# Altium schematic symbol library jlcpcb_2025_04_resistors_extended_0201.schlib: 1508 symbols (part 2 of 8) (continued)
## 0201WMJ0153TEE
designator R?  Resistance: 15kΩ  (hidden comment: *)
Resistor, 15kΩ, ±5%, 50mW, 25V, ±200ppm/℃, -55℃~+155℃, SMD 0201; Manufacturer: Uniroyal; Manufacturer Part Number: 0201WMJ0153TEE; Supplier 1: LCSC; Supplier Part Number 1: C473455; JLCPCB Part Number: C473455; Power Rating: 50mW; Category: Resistors; Package Size: 0201; JLCPCB Basic Part: Yes; Tolerance: ±5%; Voltage Rating: 25V; Temperature Coefficient: ±200ppm/℃; Temperature Rating: -55℃~+155℃; ComponentLink1Description: Datasheet; ComponentLink1URL: https://wmsc.lcsc.com/wmsc/upload/file/pdf/v2/lcsc/2205312145_UNI-ROYAL-Uniroyal-Elec-0201WMJ0153TEE_C473455.pdf; ComponentLink2Description: JLCPCB Part URL; ComponentLink2URL: https://jlcpcb.com/partdetail/C473455
pins: 1, 2
1 alternate drawing of the same symbol

## 0201WMJ0154TEE
designator R?  Resistance: 150kΩ  (hidden comment: *)
Resistor, 150kΩ, ±5%, 50mW, 25V, ±200ppm/℃, -55℃~+155℃, SMD 0201; Manufacturer: Uniroyal; Manufacturer Part Number: 0201WMJ0154TEE; Supplier 1: LCSC; Supplier Part Number 1: C473479; JLCPCB Part Number: C473479; Power Rating: 50mW; Category: Resistors; Package Size: 0201; JLCPCB Basic Part: Yes; Tolerance: ±5%; Voltage Rating: 25V; Temperature Coefficient: ±200ppm/℃; Temperature Rating: -55℃~+155℃; ComponentLink1Description: Datasheet; ComponentLink1URL: https://wmsc.lcsc.com/wmsc/upload/file/pdf/v2/lcsc/2205312145_UNI-ROYAL-Uniroyal-Elec-0201WMJ0154TEE_C473479.pdf; ComponentLink2Description: JLCPCB Part URL; ComponentLink2URL: https://jlcpcb.com/partdetail/C473479
pins: 1, 2
1 alternate drawing of the same symbol

## 0201WMJ0155TEE
designator R?  Resistance: 1500000Ω  (hidden comment: *)
Resistor, 1500000Ω, ±5%, 50mW, 25V, ±200ppm/℃, -55℃~+155℃, SMD 0201; Manufacturer: Uniroyal; Manufacturer Part Number: 0201WMJ0155TEE; Supplier 1: LCSC; Supplier Part Number 1: C423378; JLCPCB Part Number: C423378; Power Rating: 50mW; Category: Resistors; Package Size: 0201; JLCPCB Basic Part: Yes; Tolerance: ±5%; Voltage Rating: 25V; Temperature Coefficient: ±200ppm/℃; Temperature Rating: -55℃~+155℃; ComponentLink1Description: Datasheet; ComponentLink1URL: https://wmsc.lcsc.com/wmsc/upload/file/pdf/v2/lcsc/2205312145_UNI-ROYAL-Uniroyal-Elec-0201WMJ0155TEE_C423378.pdf; ComponentLink2Description: JLCPCB Part URL; ComponentLink2URL: https://jlcpcb.com/partdetail/C423378
pins: 1, 2
1 alternate drawing of the same symbol

## 0201WMJ0182TEE
designator R?  Resistance: 1.8kΩ  (hidden comment: *)
Resistor, 1.8kΩ, ±5%, 50mW, 25V, ±200ppm/℃, -55℃~+155℃, SMD 0201; Manufacturer: Uniroyal; Manufacturer Part Number: 0201WMJ0182TEE; Supplier 1: LCSC; Supplier Part Number 1: C473538; JLCPCB Part Number: C473538; Power Rating: 50mW; Category: Resistors; Package Size: 0201; JLCPCB Basic Part: Yes; Tolerance: ±5%; Voltage Rating: 25V; Temperature Coefficient: ±200ppm/℃; Temperature Rating: -55℃~+155℃; ComponentLink1Description: Datasheet; ComponentLink1URL: https://wmsc.lcsc.com/wmsc/upload/file/pdf/v2/lcsc/2205312145_UNI-ROYAL-Uniroyal-Elec-0201WMJ0182TEE_C473538.pdf; ComponentLink2Description: JLCPCB Part URL; ComponentLink2URL: https://jlcpcb.com/partdetail/C473538
pins: 1, 2
1 alternate drawing of the same symbol

## 0201WMJ0185TEE
designator R?  Resistance: 1.8MΩ  (hidden comment: *)
Resistor, 1.8MΩ, ±5%, 50mW, 25V, ±200ppm/℃, -55℃~+155℃, SMD 0201; Manufacturer: Uniroyal; Manufacturer Part Number: 0201WMJ0185TEE; Supplier 1: LCSC; Supplier Part Number 1: C474144; JLCPCB Part Number: C474144; Power Rating: 50mW; Category: Resistors; Package Size: 0201; JLCPCB Basic Part: Yes; Tolerance: ±5%; Voltage Rating: 25V; Temperature Coefficient: ±200ppm/℃; Temperature Rating: -55℃~+155℃; ComponentLink1Description: Datasheet; ComponentLink1URL: https://wmsc.lcsc.com/wmsc/upload/file/pdf/v2/lcsc/2205312130_UNI-ROYAL-Uniroyal-Elec-0201WMJ0185TEE_C474144.pdf; ComponentLink2Description: JLCPCB Part URL; ComponentLink2URL: https://jlcpcb.com/partdetail/C474144
pins: 1, 2
1 alternate drawing of the same symbol

## 0201WMJ0200TEE
designator R?  Resistance: 20Ω  (hidden comment: *)
Resistor, 20Ω, ±5%, 50mW, 25V, ±200ppm/℃, -55℃~+155℃, SMD 0201; Manufacturer: Uniroyal; Manufacturer Part Number: 0201WMJ0200TEE; Supplier 1: LCSC; Supplier Part Number 1: C473477; JLCPCB Part Number: C473477; Power Rating: 50mW; Category: Resistors; Package Size: 0201; JLCPCB Basic Part: Yes; Tolerance: ±5%; Voltage Rating: 25V; Temperature Coefficient: ±200ppm/℃; Temperature Rating: -55℃~+155℃; ComponentLink1Description: Datasheet; ComponentLink1URL: https://wmsc.lcsc.com/wmsc/upload/file/pdf/v2/lcsc/2205312145_UNI-ROYAL-Uniroyal-Elec-0201WMJ0200TEE_C473477.pdf; ComponentLink2Description: JLCPCB Part URL; ComponentLink2URL: https://jlcpcb.com/partdetail/C473477
pins: 1, 2
1 alternate drawing of the same symbol

## 0201WMJ0202TEE
designator R?  Resistance: 2kΩ  (hidden comment: *)
Resistor, 2kΩ, ±5%, 50mW, 25V, ±200ppm/℃, -55℃~+155℃, SMD 0201; Manufacturer: Uniroyal; Manufacturer Part Number: 0201WMJ0202TEE; Supplier 1: LCSC; Supplier Part Number 1: C473459; JLCPCB Part Number: C473459; Power Rating: 50mW; Category: Resistors; Package Size: 0201; JLCPCB Basic Part: Yes; Tolerance: ±5%; Voltage Rating: 25V; Temperature Coefficient: ±200ppm/℃; Temperature Rating: -55℃~+155℃; ComponentLink1Description: Datasheet; ComponentLink1URL: https://wmsc.lcsc.com/wmsc/upload/file/pdf/v2/lcsc/2205312145_UNI-ROYAL-Uniroyal-Elec-0201WMJ0202TEE_C473459.pdf; ComponentLink2Description: JLCPCB Part URL; ComponentLink2URL: https://jlcpcb.com/partdetail/C473459
pins: 1, 2
1 alternate drawing of the same symbol

## 0201WMJ0204TEE
designator R?  Resistance: 200kΩ  (hidden comment: *)
Resistor, 200kΩ, ±5%, 50mW, 25V, ±200ppm/℃, -55℃~+155℃, SMD 0201; Manufacturer: Uniroyal; Manufacturer Part Number: 0201WMJ0204TEE; Supplier 1: LCSC; Supplier Part Number 1: C270326; JLCPCB Part Number: C270326; Power Rating: 50mW; Category: Resistors; Package Size: 0201; JLCPCB Basic Part: Yes; Tolerance: ±5%; Voltage Rating: 25V; Temperature Coefficient: ±200ppm/℃; Temperature Rating: -55℃~+155℃; ComponentLink1Description: Datasheet; ComponentLink1URL: https://wmsc.lcsc.com/wmsc/upload/file/pdf/v2/lcsc/2205311945_UNI-ROYAL-Uniroyal-Elec-0201WMJ0204TEE_C270326.pdf; ComponentLink2Description: JLCPCB Part URL; ComponentLink2URL: https://jlcpcb.com/partdetail/C270326
pins: 1, 2
1 alternate drawing of the same symbol

## 0201WMJ0220TEE
designator R?  Resistance: 22Ω  (hidden comment: *)
Resistor, 22Ω, ±5%, 50mW, 25V, ±200ppm/℃, -55℃~+155℃, SMD 0201; Manufacturer: Uniroyal; Manufacturer Part Number: 0201WMJ0220TEE; Supplier 1: LCSC; Supplier Part Number 1: C270325; JLCPCB Part Number: C270325; Power Rating: 50mW; Category: Resistors; Package Size: 0201; JLCPCB Basic Part: Yes; Tolerance: ±5%; Voltage Rating: 25V; Temperature Coefficient: ±200ppm/℃; Temperature Rating: -55℃~+155℃; ComponentLink1Description: Datasheet; ComponentLink1URL: https://wmsc.lcsc.com/wmsc/upload/file/pdf/v2/lcsc/2205311945_UNI-ROYAL-Uniroyal-Elec-0201WMJ0220TEE_C270325.pdf; ComponentLink2Description: JLCPCB Part URL; ComponentLink2URL: https://jlcpcb.com/partdetail/C270325
pins: 1, 2
1 alternate drawing of the same symbol

## 0201WMJ0222TEE
designator R?  Resistance: 2200Ω  (hidden comment: *)
Resistor, 2200Ω, ±5%, 50mW, 25V, ±200ppm/℃, -55℃~+155℃, SMD 0201; Manufacturer: Uniroyal; Manufacturer Part Number: 0201WMJ0222TEE; Supplier 1: LCSC; Supplier Part Number 1: C423368; JLCPCB Part Number: C423368; Power Rating: 50mW; Category: Resistors; Package Size: 0201; JLCPCB Basic Part: Yes; Tolerance: ±5%; Voltage Rating: 25V; Temperature Coefficient: ±200ppm/℃; Temperature Rating: -55℃~+155℃; ComponentLink1Description: Datasheet; ComponentLink1URL: https://wmsc.lcsc.com/wmsc/upload/file/pdf/v2/lcsc/2205312145_UNI-ROYAL-Uniroyal-Elec-0201WMJ0222TEE_C423368.pdf; ComponentLink2Description: JLCPCB Part URL; ComponentLink2URL: https://jlcpcb.com/partdetail/C423368
pins: 1, 2
1 alternate drawing of the same symbol

## 0201WMJ0225TEE
designator R?  Resistance: 2200000Ω  (hidden comment: *)
Resistor, 2200000Ω, ±5%, 50mW, 25V, ±200ppm/℃, -55℃~+155℃, SMD 0201; Manufacturer: Uniroyal; Manufacturer Part Number: 0201WMJ0225TEE; Supplier 1: LCSC; Supplier Part Number 1: C423366; JLCPCB Part Number: C423366; Power Rating: 50mW; Category: Resistors; Package Size: 0201; JLCPCB Basic Part: Yes; Tolerance: ±5%; Voltage Rating: 25V; Temperature Coefficient: ±200ppm/℃; Temperature Rating: -55℃~+155℃; ComponentLink1Description: Datasheet; ComponentLink1URL: https://wmsc.lcsc.com/wmsc/upload/file/pdf/v2/lcsc/2205312145_UNI-ROYAL-Uniroyal-Elec-0201WMJ0225TEE_C423366.pdf; ComponentLink2Description: JLCPCB Part URL; ComponentLink2URL: https://jlcpcb.com/partdetail/C423366
pins: 1, 2
1 alternate drawing of the same symbol

## 0201WMJ0240TCE
designator R?  Resistance: 24Ω  (hidden comment: *)
Resistor, 24Ω, ±5%, 50mW, 25V, ±200ppm/℃, -55℃~+155℃, SMD 0201; Manufacturer: Uniroyal; Manufacturer Part Number: 0201WMJ0240TCE; Supplier 1: LCSC; Supplier Part Number 1: C25060; JLCPCB Part Number: C25060; Power Rating: 50mW; Category: Resistors; Package Size: 0201; JLCPCB Basic Part: Yes; Tolerance: ±5%; Voltage Rating: 25V; Temperature Coefficient: ±200ppm/℃; Temperature Rating: -55℃~+155℃; ComponentLink1Description: Datasheet; ComponentLink1URL: https://wmsc.lcsc.com/wmsc/upload/file/pdf/v2/lcsc/2205311900_UNI-ROYAL-Uniroyal-Elec-0201WMJ0240TCE_C25060.pdf; ComponentLink2Description: JLCPCB Part URL; ComponentLink2URL: https://jlcpcb.com/partdetail/C25060
pins: 1, 2
1 alternate drawing of the same symbol

## 0201WMJ0242TCE
designator R?  Resistance: 2.4kΩ  (hidden comment: *)
Resistor, 2.4kΩ, ±5%, 50mW, 25V, ±200ppm/℃, -55℃~+155℃, SMD 0201; Manufacturer: Uniroyal; Manufacturer Part Number: 0201WMJ0242TCE; Supplier 1: LCSC; Supplier Part Number 1: C25842; JLCPCB Part Number: C25842; Power Rating: 50mW; Category: Resistors; Package Size: 0201; JLCPCB Basic Part: Yes; Tolerance: ±5%; Voltage Rating: 25V; Temperature Coefficient: ±200ppm/℃; Temperature Rating: -55℃~+155℃; ComponentLink1Description: Datasheet; ComponentLink1URL: https://wmsc.lcsc.com/wmsc/upload/file/pdf/v2/lcsc/2207131030_UNI-ROYAL-Uniroyal-Elec-0201WMJ0242TCE_C25842.pdf; ComponentLink2Description: JLCPCB Part URL; ComponentLink2URL: https://jlcpcb.com/partdetail/C25842
pins: 1, 2
1 alternate drawing of the same symbol

## 0201WMJ0242TEE
designator R?  Resistance: 2400Ω  (hidden comment: *)
Resistor, 2400Ω, ±5%, 50mW, 25V, ±200ppm/℃, -55℃~+155℃, SMD 0201; Manufacturer: Uniroyal; Manufacturer Part Number: 0201WMJ0242TEE; Supplier 1: LCSC; Supplier Part Number 1: C270321; JLCPCB Part Number: C270321; Power Rating: 50mW; Category: Resistors; Package Size: 0201; JLCPCB Basic Part: Yes; Tolerance: ±5%; Voltage Rating: 25V; Temperature Coefficient: ±200ppm/℃; Temperature Rating: -55℃~+155℃; ComponentLink1Description: Datasheet; ComponentLink1URL: https://wmsc.lcsc.com/wmsc/upload/file/pdf/v2/lcsc/2205311945_UNI-ROYAL-Uniroyal-Elec-0201WMJ0242TEE_C270321.pdf; ComponentLink2Description: JLCPCB Part URL; ComponentLink2URL: https://jlcpcb.com/partdetail/C270321
pins: 1, 2
1 alternate drawing of the same symbol

## 0201WMJ0271TEE
designator R?  Resistance: 270Ω  (hidden comment: *)
Resistor, 270Ω, ±5%, 50mW, 25V, ±200ppm/℃, -55℃~+155℃, SMD 0201; Manufacturer: Uniroyal; Manufacturer Part Number: 0201WMJ0271TEE; Supplier 1: LCSC; Supplier Part Number 1: C423363; JLCPCB Part Number: C423363; Power Rating: 50mW; Category: Resistors; Package Size: 0201; JLCPCB Basic Part: Yes; Tolerance: ±5%; Voltage Rating: 25V; Temperature Coefficient: ±200ppm/℃; Temperature Rating: -55℃~+155℃; ComponentLink1Description: Datasheet; ComponentLink1URL: https://wmsc.lcsc.com/wmsc/upload/file/pdf/v2/lcsc/2205312145_UNI-ROYAL-Uniroyal-Elec-0201WMJ0271TEE_C423363.pdf; ComponentLink2Description: JLCPCB Part URL; ComponentLink2URL: https://jlcpcb.com/partdetail/C423363
pins: 1, 2
1 alternate drawing of the same symbol

## 0201WMJ0272TEE
designator R?  Resistance: 2.7kΩ  (hidden comment: *)
Resistor, 2.7kΩ, ±5%, 50mW, 25V, ±200ppm/℃, -55℃~+155℃, SMD 0201; Manufacturer: Uniroyal; Manufacturer Part Number: 0201WMJ0272TEE; Supplier 1: LCSC; Supplier Part Number 1: C474193; JLCPCB Part Number: C474193; Power Rating: 50mW; Category: Resistors; Package Size: 0201; JLCPCB Basic Part: Yes; Tolerance: ±5%; Voltage Rating: 25V; Temperature Coefficient: ±200ppm/℃; Temperature Rating: -55℃~+155℃; ComponentLink1Description: Datasheet; ComponentLink1URL: https://wmsc.lcsc.com/wmsc/upload/file/pdf/v2/lcsc/2205312045_UNI-ROYAL-Uniroyal-Elec-0201WMJ0272TEE_C474193.pdf; ComponentLink2Description: JLCPCB Part URL; ComponentLink2URL: https://jlcpcb.com/partdetail/C474193
pins: 1, 2
1 alternate drawing of the same symbol

## 0201WMJ0274TCE
designator R?  Resistance: 270kΩ  (hidden comment: *)
Resistor, 270kΩ, ±5%, 50mW, 25V, ±200ppm/℃, -55℃~+155℃, SMD 0201; Manufacturer: Uniroyal; Manufacturer Part Number: 0201WMJ0274TCE; Supplier 1: LCSC; Supplier Part Number 1: C246801; JLCPCB Part Number: C246801; Power Rating: 50mW; Category: Resistors; Package Size: 0201; JLCPCB Basic Part: Yes; Tolerance: ±5%; Voltage Rating: 25V; Temperature Coefficient: ±200ppm/℃; Temperature Rating: -55℃~+155℃; ComponentLink1Description: Datasheet; ComponentLink1URL: https://wmsc.lcsc.com/wmsc/upload/file/pdf/v2/lcsc/2205312316_UNI-ROYAL-Uniroyal-Elec-0201WMJ0274TCE_C246801.pdf; ComponentLink2Description: JLCPCB Part URL; ComponentLink2URL: https://jlcpcb.com/partdetail/C246801
pins: 1, 2
1 alternate drawing of the same symbol

## 0201WMJ0300TEE
designator R?  Resistance: 30Ω  (hidden comment: *)
Resistor, 30Ω, ±5%, 50mW, 25V, ±200ppm/℃, -55℃~+155℃, SMD 0201; Manufacturer: Uniroyal; Manufacturer Part Number: 0201WMJ0300TEE; Supplier 1: LCSC; Supplier Part Number 1: C423360; JLCPCB Part Number: C423360; Power Rating: 50mW; Category: Resistors; Package Size: 0201; JLCPCB Basic Part: Yes; Tolerance: ±5%; Voltage Rating: 25V; Temperature Coefficient: ±200ppm/℃; Temperature Rating: -55℃~+155℃; ComponentLink1Description: Datasheet; ComponentLink1URL: https://wmsc.lcsc.com/wmsc/upload/file/pdf/v2/lcsc/2205312145_UNI-ROYAL-Uniroyal-Elec-0201WMJ0300TEE_C423360.pdf; ComponentLink2Description: JLCPCB Part URL; ComponentLink2URL: https://jlcpcb.com/partdetail/C423360
pins: 1, 2
1 alternate drawing of the same symbol

## 0201WMJ0303TEE
designator R?  Resistance: 30000Ω  (hidden comment: *)
Resistor, 30000Ω, ±5%, 50mW, 25V, ±200ppm/℃, -55℃~+155℃, SMD 0201; Manufacturer: Uniroyal; Manufacturer Part Number: 0201WMJ0303TEE; Supplier 1: LCSC; Supplier Part Number 1: C423359; JLCPCB Part Number: C423359; Power Rating: 50mW; Category: Resistors; Package Size: 0201; JLCPCB Basic Part: Yes; Tolerance: ±5%; Voltage Rating: 25V; Temperature Coefficient: ±200ppm/℃; Temperature Rating: -55℃~+155℃; ComponentLink1Description: Datasheet; ComponentLink1URL: https://wmsc.lcsc.com/wmsc/upload/file/pdf/v2/lcsc/2205312145_UNI-ROYAL-Uniroyal-Elec-0201WMJ0303TEE_C423359.pdf; ComponentLink2Description: JLCPCB Part URL; ComponentLink2URL: https://jlcpcb.com/partdetail/C423359
pins: 1, 2
1 alternate drawing of the same symbol

## 0201WMJ0330TEE
designator R?  Resistance: 33Ω  (hidden comment: *)
Resistor, 33Ω, ±5%, 50mW, 25V, ±200ppm/℃, -55℃~+155℃, SMD 0201; Manufacturer: Uniroyal; Manufacturer Part Number: 0201WMJ0330TEE; Supplier 1: LCSC; Supplier Part Number 1: C423356; JLCPCB Part Number: C423356; Power Rating: 50mW; Category: Resistors; Package Size: 0201; JLCPCB Basic Part: Yes; Tolerance: ±5%; Voltage Rating: 25V; Temperature Coefficient: ±200ppm/℃; Temperature Rating: -55℃~+155℃; ComponentLink1Description: Datasheet; ComponentLink1URL: https://wmsc.lcsc.com/wmsc/upload/file/pdf/v2/lcsc/2205312145_UNI-ROYAL-Uniroyal-Elec-0201WMJ0330TEE_C423356.pdf; ComponentLink2Description: JLCPCB Part URL; ComponentLink2URL: https://jlcpcb.com/partdetail/C423356
pins: 1, 2
1 alternate drawing of the same symbol

## 0201WMJ0331TEE
designator R?  Resistance: 330Ω  (hidden comment: *)
Resistor, 330Ω, ±5%, 50mW, 25V, ±200ppm/℃, -55℃~+155℃, SMD 0201; Manufacturer: Uniroyal; Manufacturer Part Number: 0201WMJ0331TEE; Supplier 1: LCSC; Supplier Part Number 1: C473445; JLCPCB Part Number: C473445; Power Rating: 50mW; Category: Resistors; Package Size: 0201; JLCPCB Basic Part: Yes; Tolerance: ±5%; Voltage Rating: 25V; Temperature Coefficient: ±200ppm/℃; Temperature Rating: -55℃~+155℃; ComponentLink1Description: Datasheet; ComponentLink1URL: https://wmsc.lcsc.com/wmsc/upload/file/pdf/v2/lcsc/2205312145_UNI-ROYAL-Uniroyal-Elec-0201WMJ0331TEE_C473445.pdf; ComponentLink2Description: JLCPCB Part URL; ComponentLink2URL: https://jlcpcb.com/partdetail/C473445
pins: 1, 2
1 alternate drawing of the same symbol

## 0201WMJ0333TEE
designator R?  Resistance: 33kΩ  (hidden comment: *)
Resistor, 33kΩ, ±5%, 50mW, 25V, ±200ppm/℃, -55℃~+155℃, SMD 0201; Manufacturer: Uniroyal; Manufacturer Part Number: 0201WMJ0333TEE; Supplier 1: LCSC; Supplier Part Number 1: C270317; JLCPCB Part Number: C270317; Power Rating: 50mW; Category: Resistors; Package Size: 0201; JLCPCB Basic Part: Yes; Tolerance: ±5%; Voltage Rating: 25V; Temperature Coefficient: ±200ppm/℃; Temperature Rating: -55℃~+155℃; ComponentLink1Description: Datasheet; ComponentLink1URL: https://wmsc.lcsc.com/wmsc/upload/file/pdf/v2/lcsc/2205311945_UNI-ROYAL-Uniroyal-Elec-0201WMJ0333TEE_C270317.pdf; ComponentLink2Description: JLCPCB Part URL; ComponentLink2URL: https://jlcpcb.com/partdetail/C270317
pins: 1, 2
1 alternate drawing of the same symbol

## 0201WMJ0364TEE
designator R?  Resistance: 360kΩ  (hidden comment: *)
Resistor, 360kΩ, ±5%, 50mW, 25V, ±200ppm/℃, -55℃~+155℃, SMD 0201; Manufacturer: Uniroyal; Manufacturer Part Number: 0201WMJ0364TEE; Supplier 1: LCSC; Supplier Part Number 1: C423351; JLCPCB Part Number: C423351; Power Rating: 50mW; Category: Resistors; Package Size: 0201; JLCPCB Basic Part: Yes; Tolerance: ±5%; Voltage Rating: 25V; Temperature Coefficient: ±200ppm/℃; Temperature Rating: -55℃~+155℃; ComponentLink1Description: Datasheet; ComponentLink1URL: https://wmsc.lcsc.com/wmsc/upload/file/pdf/v2/lcsc/2205312145_UNI-ROYAL-Uniroyal-Elec-0201WMJ0364TEE_C423351.pdf; ComponentLink2Description: JLCPCB Part URL; ComponentLink2URL: https://jlcpcb.com/partdetail/C423351
pins: 1, 2
1 alternate drawing of the same symbol

## 0201WMJ0391TEE
designator R?  Resistance: 390Ω  (hidden comment: *)
Resistor, 390Ω, ±5%, 50mW, 25V, ±200ppm/℃, -55℃~+155℃, SMD 0201; Manufacturer: Uniroyal; Manufacturer Part Number: 0201WMJ0391TEE; Supplier 1: LCSC; Supplier Part Number 1: C473467; JLCPCB Part Number: C473467; Power Rating: 50mW; Category: Resistors; Package Size: 0201; JLCPCB Basic Part: Yes; Tolerance: ±5%; Voltage Rating: 25V; Temperature Coefficient: ±200ppm/℃; Temperature Rating: -55℃~+155℃; ComponentLink1Description: Datasheet; ComponentLink1URL: https://wmsc.lcsc.com/wmsc/upload/file/pdf/v2/lcsc/2205312145_UNI-ROYAL-Uniroyal-Elec-0201WMJ0391TEE_C473467.pdf; ComponentLink2Description: JLCPCB Part URL; ComponentLink2URL: https://jlcpcb.com/partdetail/C473467
pins: 1, 2
1 alternate drawing of the same symbol

## 0201WMJ0394TCE
designator R?  Resistance: 390kΩ  (hidden comment: *)
Resistor, 390kΩ, ±5%, 50mW, 25V, ±200ppm/℃, -55℃~+155℃, SMD 0201; Manufacturer: Uniroyal; Manufacturer Part Number: 0201WMJ0394TCE; Supplier 1: LCSC; Supplier Part Number 1: C62537; JLCPCB Part Number: C62537; Power Rating: 50mW; Category: Resistors; Package Size: 0201; JLCPCB Basic Part: Yes; Tolerance: ±5%; Voltage Rating: 25V; Temperature Coefficient: ±200ppm/℃; Temperature Rating: -55℃~+155℃; ComponentLink1Description: Datasheet; ComponentLink1URL: https://wmsc.lcsc.com/wmsc/upload/file/pdf/v2/lcsc/2205312345_UNI-ROYAL-Uniroyal-Elec-0201WMJ0394TCE_C62537.pdf; ComponentLink2Description: JLCPCB Part URL; ComponentLink2URL: https://jlcpcb.com/partdetail/C62537
pins: 1, 2
1 alternate drawing of the same symbol

## 0201WMJ0395TCE
designator R?  Resistance: 3.9MΩ  (hidden comment: *)
Resistor, 3.9MΩ, ±5%, 50mW, 25V, ±200ppm/℃, -55℃~+155℃, SMD 0201; Manufacturer: Uniroyal; Manufacturer Part Number: 0201WMJ0395TCE; Supplier 1: LCSC; Supplier Part Number 1: C407757; JLCPCB Part Number: C407757; Power Rating: 50mW; Category: Resistors; Package Size: 0201; JLCPCB Basic Part: Yes; Tolerance: ±5%; Voltage Rating: 25V; Temperature Coefficient: ±200ppm/℃; Temperature Rating: -55℃~+155℃; ComponentLink1Description: Datasheet; ComponentLink1URL: https://wmsc.lcsc.com/wmsc/upload/file/pdf/v2/lcsc/2205312245_UNI-ROYAL-Uniroyal-Elec-0201WMJ0395TCE_C407757.pdf; ComponentLink2Description: JLCPCB Part URL; ComponentLink2URL: https://jlcpcb.com/partdetail/C407757
pins: 1, 2
1 alternate drawing of the same symbol

## 0201WMJ0432TEE
designator R?  Resistance: 4300Ω  (hidden comment: *)
Resistor, 4300Ω, ±5%, 50mW, 25V, ±200ppm/℃, -55℃~+155℃, SMD 0201; Manufacturer: Uniroyal; Manufacturer Part Number: 0201WMJ0432TEE; Supplier 1: LCSC; Supplier Part Number 1: C423345; JLCPCB Part Number: C423345; Power Rating: 50mW; Category: Resistors; Package Size: 0201; JLCPCB Basic Part: Yes; Tolerance: ±5%; Voltage Rating: 25V; Temperature Coefficient: ±200ppm/℃; Temperature Rating: -55℃~+155℃; ComponentLink1Description: Datasheet; ComponentLink1URL: https://wmsc.lcsc.com/wmsc/upload/file/pdf/v2/lcsc/2205312030_UNI-ROYAL-Uniroyal-Elec-0201WMJ0432TEE_C423345.pdf; ComponentLink2Description: JLCPCB Part URL; ComponentLink2URL: https://jlcpcb.com/partdetail/C423345
pins: 1, 2
1 alternate drawing of the same symbol

## 0201WMJ0435TEE
designator R?  Resistance: 4.3MΩ  (hidden comment: *)
Resistor, 4.3MΩ, ±5%, 50mW, 25V, ±200ppm/℃, -55℃~+155℃, SMD 0201; Manufacturer: Uniroyal; Manufacturer Part Number: 0201WMJ0435TEE; Supplier 1: LCSC; Supplier Part Number 1: C784177; JLCPCB Part Number: C784177; Power Rating: 50mW; Category: Resistors; Package Size: 0201; JLCPCB Basic Part: Yes; Tolerance: ±5%; Voltage Rating: 25V; Temperature Coefficient: ±200ppm/℃; Temperature Rating: -55℃~+155℃; ComponentLink1Description: Datasheet; ComponentLink1URL: https://wmsc.lcsc.com/wmsc/upload/file/pdf/v2/lcsc/2205312045_UNI-ROYAL-Uniroyal-Elec-0201WMJ0435TEE_C784177.pdf; ComponentLink2Description: JLCPCB Part URL; ComponentLink2URL: https://jlcpcb.com/partdetail/C784177
pins: 1, 2
1 alternate drawing of the same symbol

## 0201WMJ0472TEE
designator R?  Resistance: 4.7kΩ  (hidden comment: *)
Resistor, 4.7kΩ, ±5%, 50mW, 25V, ±200ppm/℃, -55℃~+155℃, SMD 0201; Manufacturer: Uniroyal; Manufacturer Part Number: 0201WMJ0472TEE; Supplier 1: LCSC; Supplier Part Number 1: C270314; JLCPCB Part Number: C270314; Power Rating: 50mW; Category: Resistors; Package Size: 0201; JLCPCB Basic Part: Yes; Tolerance: ±5%; Voltage Rating: 25V; Temperature Coefficient: ±200ppm/℃; Temperature Rating: -55℃~+155℃; ComponentLink1Description: Datasheet; ComponentLink1URL: https://wmsc.lcsc.com/wmsc/upload/file/pdf/v2/lcsc/2205311945_UNI-ROYAL-Uniroyal-Elec-0201WMJ0472TEE_C270314.pdf; ComponentLink2Description: JLCPCB Part URL; ComponentLink2URL: https://jlcpcb.com/partdetail/C270314
pins: 1, 2
1 alternate drawing of the same symbol

## 0201WMJ0473TEE
designator R?  Resistance: 47kΩ  (hidden comment: *)
Resistor, 47kΩ, ±5%, 50mW, 25V, ±200ppm/℃, -55℃~+155℃, SMD 0201; Manufacturer: Uniroyal; Manufacturer Part Number: 0201WMJ0473TEE; Supplier 1: LCSC; Supplier Part Number 1: C270313; JLCPCB Part Number: C270313; Power Rating: 50mW; Category: Resistors; Package Size: 0201; JLCPCB Basic Part: Yes; Tolerance: ±5%; Voltage Rating: 25V; Temperature Coefficient: ±200ppm/℃; Temperature Rating: -55℃~+155℃; ComponentLink1Description: Datasheet; ComponentLink1URL: https://wmsc.lcsc.com/wmsc/upload/file/pdf/v2/lcsc/2205311945_UNI-ROYAL-Uniroyal-Elec-0201WMJ0473TEE_C270313.pdf; ComponentLink2Description: JLCPCB Part URL; ComponentLink2URL: https://jlcpcb.com/partdetail/C270313
pins: 1, 2
1 alternate drawing of the same symbol

## 0201WMJ0510TEE
designator R?  Resistance: 51Ω  (hidden comment: *)
Resistor, 51Ω, ±5%, 50mW, 25V, ±200ppm/℃, -55℃~+155℃, SMD 0201; Manufacturer: Uniroyal; Manufacturer Part Number: 0201WMJ0510TEE; Supplier 1: LCSC; Supplier Part Number 1: C270311; JLCPCB Part Number: C270311; Power Rating: 50mW; Category: Resistors; Package Size: 0201; JLCPCB Basic Part: Yes; Tolerance: ±5%; Voltage Rating: 25V; Temperature Coefficient: ±200ppm/℃; Temperature Rating: -55℃~+155℃; ComponentLink1Description: Datasheet; ComponentLink1URL: https://wmsc.lcsc.com/wmsc/upload/file/pdf/v2/lcsc/2205311945_UNI-ROYAL-Uniroyal-Elec-0201WMJ0510TEE_C270311.pdf; ComponentLink2Description: JLCPCB Part URL; ComponentLink2URL: https://jlcpcb.com/partdetail/C270311
pins: 1, 2
1 alternate drawing of the same symbol

## 0201WMJ0511TEE
designator R?  Resistance: 510Ω  (hidden comment: *)
Resistor, 510Ω, ±5%, 50mW, 25V, ±200ppm/℃, -55℃~+155℃, SMD 0201; Manufacturer: Uniroyal; Manufacturer Part Number: 0201WMJ0511TEE; Supplier 1: LCSC; Supplier Part Number 1: C473605; JLCPCB Part Number: C473605; Power Rating: 50mW; Category: Resistors; Package Size: 0201; JLCPCB Basic Part: Yes; Tolerance: ±5%; Voltage Rating: 25V; Temperature Coefficient: ±200ppm/℃; Temperature Rating: -55℃~+155℃; ComponentLink1Description: Datasheet; ComponentLink1URL: https://wmsc.lcsc.com/wmsc/upload/file/pdf/v2/lcsc/2205312130_UNI-ROYAL-Uniroyal-Elec-0201WMJ0511TEE_C473605.pdf; ComponentLink2Description: JLCPCB Part URL; ComponentLink2URL: https://jlcpcb.com/partdetail/C473605
pins: 1, 2
1 alternate drawing of the same symbol

## 0201WMJ0512TEE
designator R?  Resistance: 5.1kΩ  (hidden comment: *)
Resistor, 5.1kΩ, ±5%, 50mW, 25V, ±200ppm/℃, -55℃~+155℃, SMD 0201; Manufacturer: Uniroyal; Manufacturer Part Number: 0201WMJ0512TEE; Supplier 1: LCSC; Supplier Part Number 1: C473460; JLCPCB Part Number: C473460; Power Rating: 50mW; Category: Resistors; Package Size: 0201; JLCPCB Basic Part: Yes; Tolerance: ±5%; Voltage Rating: 25V; Temperature Coefficient: ±200ppm/℃; Temperature Rating: -55℃~+155℃; ComponentLink1Description: Datasheet; ComponentLink1URL: https://wmsc.lcsc.com/wmsc/upload/file/pdf/v2/lcsc/2205312145_UNI-ROYAL-Uniroyal-Elec-0201WMJ0512TEE_C473460.pdf; ComponentLink2Description: JLCPCB Part URL; ComponentLink2URL: https://jlcpcb.com/partdetail/C473460
pins: 1, 2
1 alternate drawing of the same symbol

## 0201WMJ0564TEE
designator R?  Resistance: 560000Ω  (hidden comment: *)
Resistor, 560000Ω, ±5%, 50mW, 25V, ±200ppm/℃, -55℃~+155℃, SMD 0201; Manufacturer: Uniroyal; Manufacturer Part Number: 0201WMJ0564TEE; Supplier 1: LCSC; Supplier Part Number 1: C473616; JLCPCB Part Number: C473616; Power Rating: 50mW; Category: Resistors; Package Size: 0201; JLCPCB Basic Part: Yes; Tolerance: ±5%; Voltage Rating: 25V; Temperature Coefficient: ±200ppm/℃; Temperature Rating: -55℃~+155℃; ComponentLink1Description: Datasheet; ComponentLink1URL: https://wmsc.lcsc.com/wmsc/upload/file/pdf/v2/lcsc/2205312030_UNI-ROYAL-Uniroyal-Elec-0201WMJ0564TEE_C473616.pdf; ComponentLink2Description: JLCPCB Part URL; ComponentLink2URL: https://jlcpcb.com/partdetail/C473616
pins: 1, 2
1 alternate drawing of the same symbol

## 0201WMJ0621TEE
designator R?  Resistance: 620Ω  (hidden comment: *)
Resistor, 620Ω, ±5%, 50mW, 25V, ±200ppm/℃, -55℃~+155℃, SMD 0201; Manufacturer: Uniroyal; Manufacturer Part Number: 0201WMJ0621TEE; Supplier 1: LCSC; Supplier Part Number 1: C423335; JLCPCB Part Number: C423335; Power Rating: 50mW; Category: Resistors; Package Size: 0201; JLCPCB Basic Part: Yes; Tolerance: ±5%; Voltage Rating: 25V; Temperature Coefficient: ±200ppm/℃; Temperature Rating: -55℃~+155℃; ComponentLink1Description: Datasheet; ComponentLink1URL: https://wmsc.lcsc.com/wmsc/upload/file/pdf/v2/lcsc/2205312030_UNI-ROYAL-Uniroyal-Elec-0201WMJ0621TEE_C423335.pdf; ComponentLink2Description: JLCPCB Part URL; ComponentLink2URL: https://jlcpcb.com/partdetail/C423335
pins: 1, 2
1 alternate drawing of the same symbol

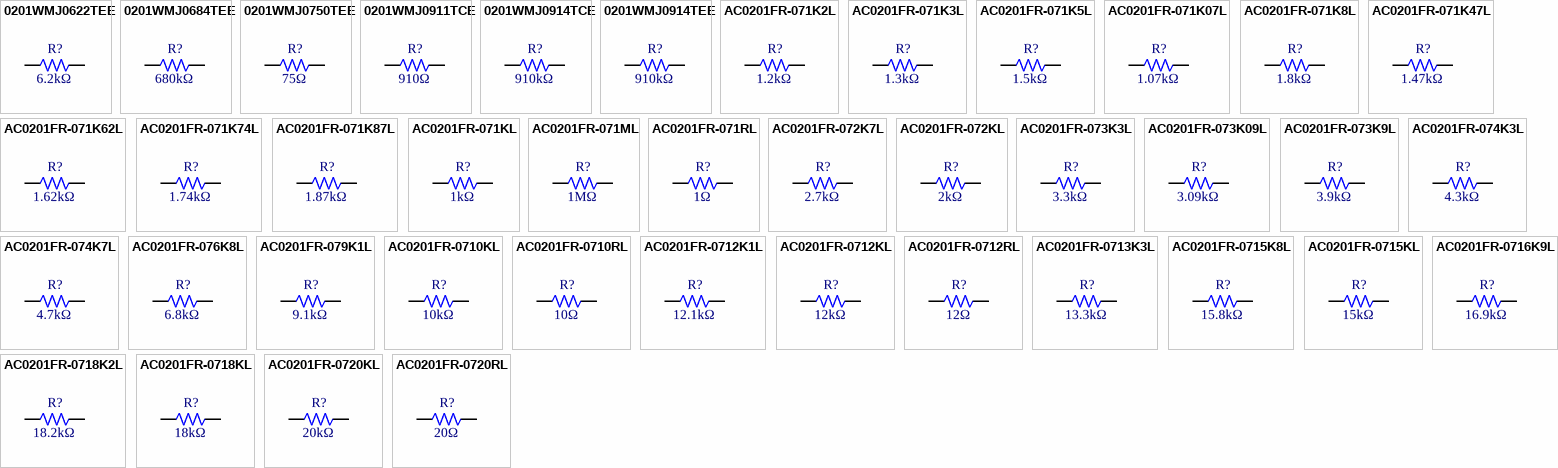
[diagram p8: symbols 0201WMJ0622TEE to AC0201FR-0720RL]

## 0201WMJ0622TEE
designator R?  Resistance: 6.2kΩ  (hidden comment: *)
Resistor, 6.2kΩ, ±5%, 50mW, 25V, ±200ppm/℃, -55℃~+155℃, SMD 0201; Manufacturer: Uniroyal; Manufacturer Part Number: 0201WMJ0622TEE; Supplier 1: LCSC; Supplier Part Number 1: C423334; JLCPCB Part Number: C423334; Power Rating: 50mW; Category: Resistors; Package Size: 0201; JLCPCB Basic Part: Yes; Tolerance: ±5%; Voltage Rating: 25V; Temperature Coefficient: ±200ppm/℃; Temperature Rating: -55℃~+155℃; ComponentLink1Description: Datasheet; ComponentLink1URL: https://wmsc.lcsc.com/wmsc/upload/file/pdf/v2/lcsc/2205312030_UNI-ROYAL-Uniroyal-Elec-0201WMJ0622TEE_C423334.pdf; ComponentLink2Description: JLCPCB Part URL; ComponentLink2URL: https://jlcpcb.com/partdetail/C423334
pins: 1, 2
1 alternate drawing of the same symbol

## 0201WMJ0684TEE
designator R?  Resistance: 680kΩ  (hidden comment: *)
Resistor, 680kΩ, ±5%, 50mW, 25V, ±200ppm/℃, -55℃~+155℃, SMD 0201; Manufacturer: Uniroyal; Manufacturer Part Number: 0201WMJ0684TEE; Supplier 1: LCSC; Supplier Part Number 1: C473490; JLCPCB Part Number: C473490; Power Rating: 50mW; Category: Resistors; Package Size: 0201; JLCPCB Basic Part: Yes; Tolerance: ±5%; Voltage Rating: 25V; Temperature Coefficient: ±200ppm/℃; Temperature Rating: -55℃~+155℃; ComponentLink1Description: Datasheet; ComponentLink1URL: https://wmsc.lcsc.com/wmsc/upload/file/pdf/v2/lcsc/2205312145_UNI-ROYAL-Uniroyal-Elec-0201WMJ0684TEE_C473490.pdf; ComponentLink2Description: JLCPCB Part URL; ComponentLink2URL: https://jlcpcb.com/partdetail/C473490
pins: 1, 2
1 alternate drawing of the same symbol

## 0201WMJ0750TEE
designator R?  Resistance: 75Ω  (hidden comment: *)
Resistor, 75Ω, ±5%, 50mW, 25V, ±200ppm/℃, -55℃~+155℃, SMD 0201; Manufacturer: Uniroyal; Manufacturer Part Number: 0201WMJ0750TEE; Supplier 1: LCSC; Supplier Part Number 1: C473570; JLCPCB Part Number: C473570; Power Rating: 50mW; Category: Resistors; Package Size: 0201; JLCPCB Basic Part: Yes; Tolerance: ±5%; Voltage Rating: 25V; Temperature Coefficient: ±200ppm/℃; Temperature Rating: -55℃~+155℃; ComponentLink1Description: Datasheet; ComponentLink1URL: https://wmsc.lcsc.com/wmsc/upload/file/pdf/v2/lcsc/2205312145_UNI-ROYAL-Uniroyal-Elec-0201WMJ0750TEE_C473570.pdf; ComponentLink2Description: JLCPCB Part URL; ComponentLink2URL: https://jlcpcb.com/partdetail/C473570
pins: 1, 2
1 alternate drawing of the same symbol

## 0201WMJ0911TCE
designator R?  Resistance: 910Ω  (hidden comment: *)
Resistor, 910Ω, ±5%, 50mW, 25V, ±200ppm/℃, -55℃~+155℃, SMD 0201; Manufacturer: Uniroyal; Manufacturer Part Number: 0201WMJ0911TCE; Supplier 1: LCSC; Supplier Part Number 1: C270659; JLCPCB Part Number: C270659; Power Rating: 50mW; Category: Resistors; Package Size: 0201; JLCPCB Basic Part: Yes; Tolerance: ±5%; Voltage Rating: 25V; Temperature Coefficient: ±200ppm/℃; Temperature Rating: -55℃~+155℃; ComponentLink1Description: Datasheet; ComponentLink1URL: https://wmsc.lcsc.com/wmsc/upload/file/pdf/v2/lcsc/2205312300_UNI-ROYAL-Uniroyal-Elec-0201WMJ0911TCE_C270659.pdf; ComponentLink2Description: JLCPCB Part URL; ComponentLink2URL: https://jlcpcb.com/partdetail/C270659
pins: 1, 2
1 alternate drawing of the same symbol

## 0201WMJ0914TCE
designator R?  Resistance: 910kΩ  (hidden comment: *)
Resistor, 910kΩ, ±5%, 50mW, 25V, ±200ppm/℃, -55℃~+155℃, SMD 0201; Manufacturer: Uniroyal; Manufacturer Part Number: 0201WMJ0914TCE; Supplier 1: LCSC; Supplier Part Number 1: C247557; JLCPCB Part Number: C247557; Power Rating: 50mW; Category: Resistors; Package Size: 0201; JLCPCB Basic Part: Yes; Tolerance: ±5%; Voltage Rating: 25V; Temperature Coefficient: ±200ppm/℃; Temperature Rating: -55℃~+155℃; ComponentLink1Description: Datasheet; ComponentLink1URL: https://wmsc.lcsc.com/wmsc/upload/file/pdf/v2/lcsc/2205311945_UNI-ROYAL-Uniroyal-Elec-0201WMJ0914TCE_C247557.pdf; ComponentLink2Description: JLCPCB Part URL; ComponentLink2URL: https://jlcpcb.com/partdetail/C247557
pins: 1, 2
1 alternate drawing of the same symbol

## 0201WMJ0914TEE
designator R?  Resistance: 910kΩ  (hidden comment: *)
Resistor, 910kΩ, ±5%, 50mW, 25V, ±200ppm/℃, -55℃~+155℃, SMD 0201; Manufacturer: Uniroyal; Manufacturer Part Number: 0201WMJ0914TEE; Supplier 1: LCSC; Supplier Part Number 1: C423321; JLCPCB Part Number: C423321; Power Rating: 50mW; Category: Resistors; Package Size: 0201; JLCPCB Basic Part: Yes; Tolerance: ±5%; Voltage Rating: 25V; Temperature Coefficient: ±200ppm/℃; Temperature Rating: -55℃~+155℃; ComponentLink1Description: Datasheet; ComponentLink1URL: https://wmsc.lcsc.com/wmsc/upload/file/pdf/v2/lcsc/2205312145_UNI-ROYAL-Uniroyal-Elec-0201WMJ0914TEE_C423321.pdf; ComponentLink2Description: JLCPCB Part URL; ComponentLink2URL: https://jlcpcb.com/partdetail/C423321
pins: 1, 2
1 alternate drawing of the same symbol

## AC0201FR-071K2L
designator R?  Resistance: 1.2kΩ  (hidden comment: *)
Resistor, 1.2kΩ, ±1%, 50mW, 25V, ±200ppm/℃, -55℃~+155℃, SMD 0201; Manufacturer: Uniroyal; Manufacturer Part Number: AC0201FR-071K2L; Supplier 1: LCSC; Supplier Part Number 1: C226448; JLCPCB Part Number: C226448; Power Rating: 50mW; Category: Resistors; Package Size: 0201; JLCPCB Basic Part: Yes; Tolerance: ±1%; Voltage Rating: 25V; Temperature Coefficient: ±200ppm/℃; Temperature Rating: -55℃~+155℃; ComponentLink1Description: Datasheet; ComponentLink1URL: https://wmsc.lcsc.com/wmsc/upload/file/pdf/v2/lcsc/2111171830_YAGEO-AC0201FR-071K2L_C226448.pdf; ComponentLink2Description: JLCPCB Part URL; ComponentLink2URL: https://jlcpcb.com/partdetail/C226448
pins: 1, 2
1 alternate drawing of the same symbol

## AC0201FR-071K3L
designator R?  Resistance: 1.3kΩ  (hidden comment: *)
Resistor, 1.3kΩ, ±1%, 50mW, 25V, ±200ppm/℃, -55℃~+155℃, SMD 0201; Manufacturer: Uniroyal; Manufacturer Part Number: AC0201FR-071K3L; Supplier 1: LCSC; Supplier Part Number 1: C226451; JLCPCB Part Number: C226451; Power Rating: 50mW; Category: Resistors; Package Size: 0201; JLCPCB Basic Part: Yes; Tolerance: ±1%; Voltage Rating: 25V; Temperature Coefficient: ±200ppm/℃; Temperature Rating: -55℃~+155℃; ComponentLink1Description: Datasheet; ComponentLink1URL: https://wmsc.lcsc.com/wmsc/upload/file/pdf/v2/lcsc/2112131730_YAGEO-AC0201FR-071K3L_C226451.pdf; ComponentLink2Description: JLCPCB Part URL; ComponentLink2URL: https://jlcpcb.com/partdetail/C226451
pins: 1, 2
1 alternate drawing of the same symbol

## AC0201FR-071K5L
designator R?  Resistance: 1.5kΩ  (hidden comment: *)
Resistor, 1.5kΩ, ±1%, 50mW, 25V, ±200ppm/℃, -55℃~+155℃, SMD 0201; Manufacturer: Uniroyal; Manufacturer Part Number: AC0201FR-071K5L; Supplier 1: LCSC; Supplier Part Number 1: C226454; JLCPCB Part Number: C226454; Power Rating: 50mW; Category: Resistors; Package Size: 0201; JLCPCB Basic Part: Yes; Tolerance: ±1%; Voltage Rating: 25V; Temperature Coefficient: ±200ppm/℃; Temperature Rating: -55℃~+155℃; ComponentLink1Description: Datasheet; ComponentLink1URL: https://wmsc.lcsc.com/wmsc/upload/file/pdf/v2/lcsc/2008251104_YAGEO-AC0201FR-071K5L_C226454.pdf; ComponentLink2Description: JLCPCB Part URL; ComponentLink2URL: https://jlcpcb.com/partdetail/C226454
pins: 1, 2
1 alternate drawing of the same symbol

## AC0201FR-071K07L
designator R?  Resistance: 1.07kΩ  (hidden comment: *)
Resistor, 1.07kΩ, ±1%, 50mW, 25V, ±200ppm/℃, -55℃~+155℃, SMD 0201; Manufacturer: Uniroyal; Manufacturer Part Number: AC0201FR-071K07L; Supplier 1: LCSC; Supplier Part Number 1: C910611; JLCPCB Part Number: C910611; Power Rating: 50mW; Category: Resistors; Package Size: 0201; JLCPCB Basic Part: Yes; Tolerance: ±1%; Voltage Rating: 25V; Temperature Coefficient: ±200ppm/℃; Temperature Rating: -55℃~+155℃; ComponentLink1Description: Datasheet; ComponentLink1URL: https://wmsc.lcsc.com/wmsc/upload/file/pdf/v2/lcsc/2201242100_YAGEO-AC0201FR-071K07L_C910611.pdf; ComponentLink2Description: JLCPCB Part URL; ComponentLink2URL: https://jlcpcb.com/partdetail/C910611
pins: 1, 2
1 alternate drawing of the same symbol

## AC0201FR-071K8L
designator R?  Resistance: 1.8kΩ  (hidden comment: *)
Resistor, 1.8kΩ, ±1%, 50mW, ±200ppm/℃, -55℃~+155℃, SMD 0201; Manufacturer: Uniroyal; Manufacturer Part Number: AC0201FR-071K8L; Supplier 1: LCSC; Supplier Part Number 1: C226457; JLCPCB Part Number: C226457; Power Rating: 50mW; Category: Resistors; Package Size: 0201; JLCPCB Basic Part: Yes; Tolerance: ±1%; Temperature Coefficient: ±200ppm/℃; Temperature Rating: -55℃~+155℃; ComponentLink1Description: Datasheet; ComponentLink1URL: https://wmsc.lcsc.com/wmsc/upload/file/pdf/v2/lcsc/2112171030_YAGEO-AC0201FR-071K8L_C226457.pdf; ComponentLink2Description: JLCPCB Part URL; ComponentLink2URL: https://jlcpcb.com/partdetail/C226457
pins: 1, 2
1 alternate drawing of the same symbol

## AC0201FR-071K47L
designator R?  Resistance: 1.47kΩ  (hidden comment: *)
Resistor, 1.47kΩ, ±1%, 50mW, 25V, ±200ppm/℃, -55℃~+155℃, SMD 0201; Manufacturer: Uniroyal; Manufacturer Part Number: AC0201FR-071K47L; Supplier 1: LCSC; Supplier Part Number 1: C2095890; JLCPCB Part Number: C2095890; Power Rating: 50mW; Category: Resistors; Package Size: 0201; JLCPCB Basic Part: Yes; Tolerance: ±1%; Voltage Rating: 25V; Temperature Coefficient: ±200ppm/℃; Temperature Rating: -55℃~+155℃; ComponentLink1Description: Datasheet; ComponentLink1URL: https://wmsc.lcsc.com/wmsc/upload/file/pdf/v2/lcsc/2202020630_YAGEO-AC0201FR-071K47L_C2095890.pdf; ComponentLink2Description: JLCPCB Part URL; ComponentLink2URL: https://jlcpcb.com/partdetail/C2095890
pins: 1, 2
1 alternate drawing of the same symbol

## AC0201FR-071K62L
designator R?  Resistance: 1.62kΩ  (hidden comment: *)
Resistor, 1.62kΩ, ±1%, 50mW, 25V, ±200ppm/℃, -55℃~+155℃, SMD 0201; Manufacturer: Uniroyal; Manufacturer Part Number: AC0201FR-071K62L; Supplier 1: LCSC; Supplier Part Number 1: C910613; JLCPCB Part Number: C910613; Power Rating: 50mW; Category: Resistors; Package Size: 0201; JLCPCB Basic Part: Yes; Tolerance: ±1%; Voltage Rating: 25V; Temperature Coefficient: ±200ppm/℃; Temperature Rating: -55℃~+155℃; ComponentLink1Description: Datasheet; ComponentLink1URL: https://wmsc.lcsc.com/wmsc/upload/file/pdf/v2/lcsc/2201242100_YAGEO-AC0201FR-071K62L_C910613.pdf; ComponentLink2Description: JLCPCB Part URL; ComponentLink2URL: https://jlcpcb.com/partdetail/C910613
pins: 1, 2
1 alternate drawing of the same symbol

## AC0201FR-071K74L
designator R?  Resistance: 1.74kΩ  (hidden comment: *)
Resistor, 1.74kΩ, ±1%, 50mW, ±200ppm/℃, -55℃~+155℃, SMD 0201; Manufacturer: Uniroyal; Manufacturer Part Number: AC0201FR-071K74L; Supplier 1: LCSC; Supplier Part Number 1: C910614; JLCPCB Part Number: C910614; Power Rating: 50mW; Category: Resistors; Package Size: 0201; JLCPCB Basic Part: Yes; Tolerance: ±1%; Temperature Coefficient: ±200ppm/℃; Temperature Rating: -55℃~+155℃; ComponentLink1Description: Datasheet; ComponentLink1URL: https://wmsc.lcsc.com/wmsc/upload/file/pdf/v2/lcsc/2201242100_YAGEO-AC0201FR-071K74L_C910614.pdf; ComponentLink2Description: JLCPCB Part URL; ComponentLink2URL: https://jlcpcb.com/partdetail/C910614
pins: 1, 2
1 alternate drawing of the same symbol

## AC0201FR-071K87L
designator R?  Resistance: 1.87kΩ  (hidden comment: *)
Resistor, 1.87kΩ, ±1%, 50mW, 25V, ±200ppm/℃, -55℃~+155℃, SMD 0201; Manufacturer: Uniroyal; Manufacturer Part Number: AC0201FR-071K87L; Supplier 1: LCSC; Supplier Part Number 1: C910615; JLCPCB Part Number: C910615; Power Rating: 50mW; Category: Resistors; Package Size: 0201; JLCPCB Basic Part: Yes; Tolerance: ±1%; Voltage Rating: 25V; Temperature Coefficient: ±200ppm/℃; Temperature Rating: -55℃~+155℃; ComponentLink1Description: Datasheet; ComponentLink1URL: https://wmsc.lcsc.com/wmsc/upload/file/pdf/v2/lcsc/2201242100_YAGEO-AC0201FR-071K87L_C910615.pdf; ComponentLink2Description: JLCPCB Part URL; ComponentLink2URL: https://jlcpcb.com/partdetail/C910615
pins: 1, 2
1 alternate drawing of the same symbol

## AC0201FR-071KL
designator R?  Resistance: 1kΩ  (hidden comment: *)
Resistor, 1kΩ, ±1%, 50mW, 25V, ±200ppm/℃, -55℃~+155℃, SMD 0201; Manufacturer: Uniroyal; Manufacturer Part Number: AC0201FR-071KL; Supplier 1: LCSC; Supplier Part Number 1: C226458; JLCPCB Part Number: C226458; Power Rating: 50mW; Category: Resistors; Package Size: 0201; JLCPCB Basic Part: Yes; Tolerance: ±1%; Voltage Rating: 25V; Temperature Coefficient: ±200ppm/℃; Temperature Rating: -55℃~+155℃; ComponentLink1Description: Datasheet; ComponentLink1URL: https://wmsc.lcsc.com/wmsc/upload/file/pdf/v2/lcsc/2008251104_YAGEO-AC0201FR-071KL_C226458.pdf; ComponentLink2Description: JLCPCB Part URL; ComponentLink2URL: https://jlcpcb.com/partdetail/C226458
pins: 1, 2
1 alternate drawing of the same symbol
